# Altium integrated library Integrated_Library - 02.02.25 - 22.49.IntLib: 792 symbols (part 3 of 11) (continued)
## CMP-004-00015-2
designator D?, comment BAT54S-7-F
Surface Mount Schottky Barrier Diode, 30 V, 200 mA, -65 to 150 degC, 3-Pin SOT23, RoHS, Tape and Reel; Manufacturer: Diodes Inc; Max Surge Current: 600mA; Elements: 2; Forward Voltage: 800mV; Peak Reverse Current: 2uA; Recovery Time: 5ns; Forward Current: 200mA; Element Configuration: CommonCathode; Power: 200mW; Datasheet Version: Rev. 31-2, 10/2013; Package Quantity: 3000; RoHS Compliant: True; Packaging: TapeandReel; Datasheet URL: http://www.diodes.com/_files/datasheets/ds11005.pdf; Case/Package: TO-236-3; Max Operating Temperature: 125°C; Min Operating Temperature: -65°C; Manufacturer URL: http://www.diodes.com/; Package Reference: SOT23-3; Mounting Technology: SM; Pins: 3; Package Description: 3-Pin Small Outline Transistor, Body 2.9 x 1.3 mm, Pitch 0.96 mm
footprint DIOD-SOT23-3_V (SOT23, 3-Leads, Body 3x1.4mm, Pitch 0.95mm)
pins: 1 A, 2 K, 3 C

## CMP-004-00016-2
designator D?, comment SS12
Schottky Rectifier, 20 V, 1 A, -65 to 125 degC, 2-Pin DO-214AC, RoHS, Tape and Reel; Manufacturer: Fairchild; Forward Voltage: 500mV; Peak Reverse Current: 200uA; Max Surge Current: 40A; Min Operating Temperature: -65°C; Packaging: TapeandReel; Datasheet URL: https://www.fairchildsemi.com/datasheets/SS/SS12.pdf; Datasheet Version: Rev. 1.9, 01/2015; Package URL: https://www.fairchildsemi.com/package-drawings/DO/DO214AC.pdf; Package Description: 2-Pin Surface Mount Device, Body 4.375 x 2.725 mm; Manufacturer URL: https://www.fairchildsemi.com/; Mounting Technology: SM; Case/Package: SMA; RoHS Compliant: True; Package Quantity: 7500; Pins: 2; Max Operating Temperature: 125°C; Package Reference: DO-214AC-2
footprint FAIR-DO-214AC-2_V (DO-214, 2-Leads, Body 4.375x2.725mm)
pins: 1 A, 2 K

## CMP-004-00017-2
designator D?, comment SS12-E3/61T
Schottky Barrier Rectifier, 20 V, 1 A, -65 to 150 degC, 2-Pin DO-214AC (SMA), RoHS, Tape and Reel; Manufacturer: Vishay Semiconductor; Forward Voltage: 500mV; Peak Reverse Current: 6mA; Max Surge Current: 40A; Forward Current: 1A; Package Quantity: 1800; Datasheet URL: http://www.vishay.com/docs/88746/ss12.pdf; Manufacturer URL: http://www.vishay.com/; Package Reference: DO-214AC (SMA); Max Operating Temperature: 125°C; Mounting Technology: SM; Case/Package: SMA; Min Operating Temperature: -65°C; Package Description: 2-Pin Surface Mount Device, Body 4.245 x 2.665 mm; RoHS Compliant: True; Datasheet Version: Aug-15; Pins: 2; Packaging: TapeandReel
footprint VISH-DO-214AC_V (Molded Diode, 2-Leads, Body 4.5x2.79mm)
pins: 1 A, 2 K

## CMP-004-00018-2
designator D?, comment SS12-TP
Schottky Rectifier, 20 V, 1 A, -55 to 125 degC, 2-Pin DO-214AC, RoHS, Tape and Reel; Manufacturer: Micro Commercial Components; Forward Voltage: 450mV; Max Surge Current: 30A; Forward Current: 1A; Peak Reverse Current: 500uA; Package Quantity: 1; Packaging: CutTape; Datasheet Version: Rev. B, 11/2011; Manufacturer URL: http://www.mccsemi.com/; Max Operating Temperature: 125°C; Pins: 2; Min Operating Temperature: -55°C; Package Reference: DO-214AC-2; Case/Package: SMA; Package Description: 2-Pin Molded Diode, Body 4.315 x 2.705 mm; Mounting Technology: SM; Datasheet URL: http://www.mccsemi.com/up_pdf/SS12-SS110(HSMA).PDF; RoHS Compliant: True
footprint MCC-DO-214AC-2_V (Molded Diode, 2-Leads, Body 4.57x2.84mm)
pins: 1 A, 2 K

## CMP-004-00019-2
designator D?, comment CESD5V0AP
Uni-direction ESD Protection Diode, 5 V, 10 uA, 3-Pin SOT23, RoHS, Tape and Reel; Manufacturer: Jiangsu Changjiang Electronics Technology; Package Version: Rev. E, 09/2009; RoHS Compliant: Unknown; Mounting Technology: SM; Package Description: 3-Pin Small Outline Transistor, Body 2.9 x 1.3 mm, Pitch 0.95 mm; Datasheet URL: http://www.cj-elec.com/gallery/txUpfile/c44551eb678d297ed58d78171eee05d7.pdf; Case/Package: SOT23-3; Package URL: http://www.cj-elec.com/gallery/txUpfile/201412381536055.pdf; Package Reference: SOT23-3; Datasheet Version: Rev. C, 04/2014
footprint JSCJ-SOT23-3_V (SOT23, 3-Leads, Body 3x1.4mm, Pitch 0.95mm)
pins: 1 K, 2 K, 3 A

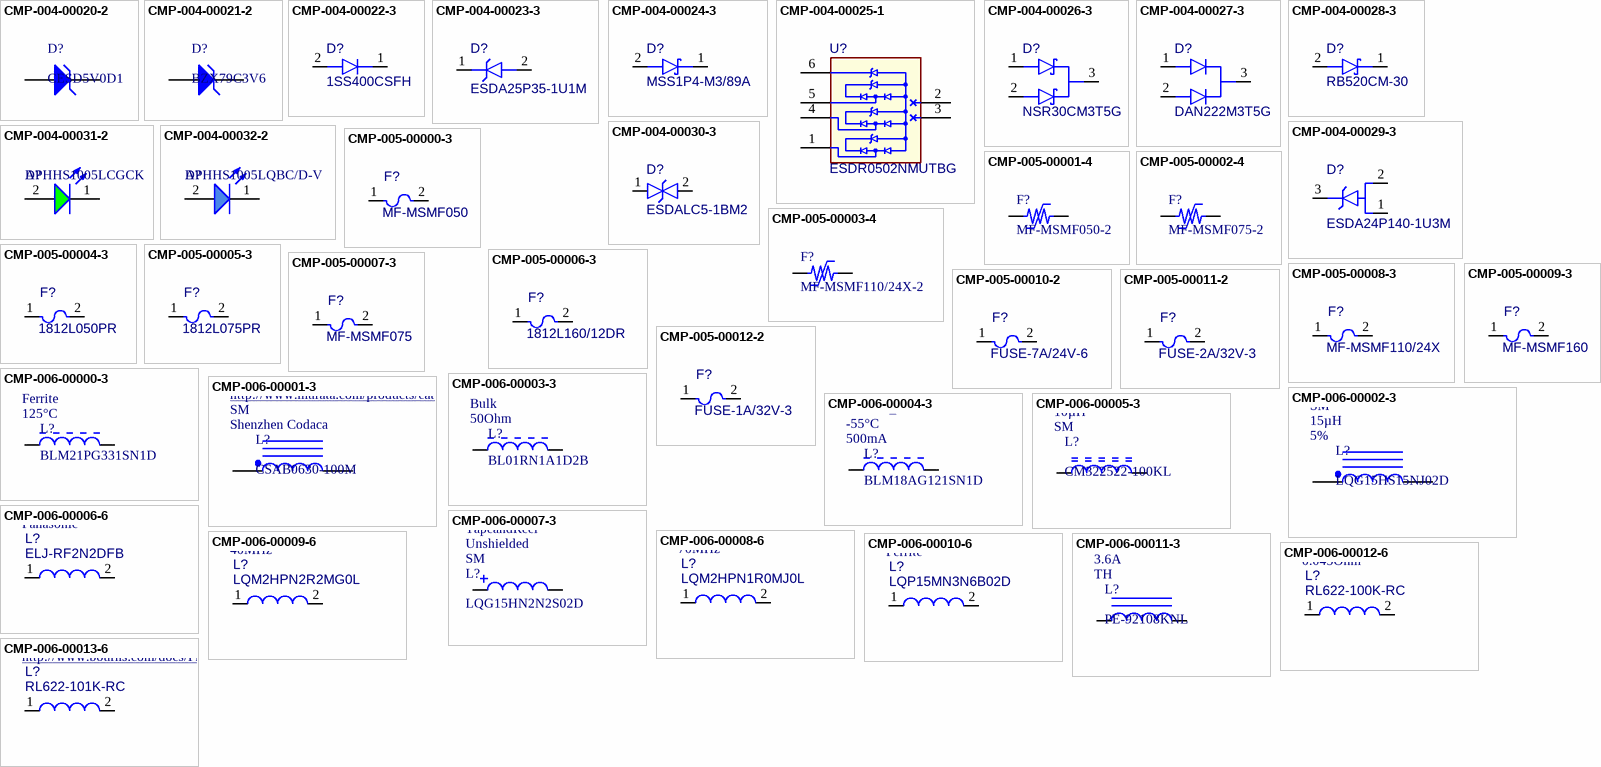
[diagram p7: symbols CMP-004-00020-2 to CMP-006-00013-6]

## CMP-004-00020-2
designator D?, comment CESD5V0D1
Uni-driection ESD Protection Diode, 5 V, 1 uA, 2-Pin SOD-123, RoHS, Tape and Reel; Manufacturer: Jiangsu Changjiang Electronics Technology; Datasheet URL: http://www.cj-elec.com/gallery/txUpfile/f05a5831e2d7f622a930855050fbe076.pdf; Datasheet Version: Rev. B, 04/2014; Package Description: 2-Pin Surface Mount Device, Body 2.7 x 1.6 mm; Package Reference: SOD-123-2; RoHS Compliant: Unknown; Package URL: http://www.cj-elec.com/txUpfile/201412112231195145.pdf; Case/Package: SOD-123-2; Mounting Technology: SM
footprint JSCJ-SOD-123-2_V (SOD, 2-Leads, Body 2.7x1.6mm)
pins: 1 A, 2 K

## CMP-004-00021-2
designator D?, comment BZX79C3V6
Zener Diode, 3.6 V, 5 mA, -65 to 200 degC, 2-Pin DO-35, RoHS, Bulk; Manufacturer: Fairchild Semiconductor; Tolerance: 6%; Power: 500mW; Forward Voltage: 1.5V; Impedance: 90Ohm; Package Quantity: 1000; Min Operating Temperature: -65°C; Datasheet Version: Rev. C1, 07/2007; Max Operating Temperature: 200°C; Mounting Technology: TH; Package Description: 2-Pin Through Hole Diode, Dia 1.72 mm, Body Length 3.805 mm; RoHS Compliant: True; Manufacturer URL: https://www.fairchildsemi.com/; Package Reference: DO-35-2; Case/Package: DO-35-2; Datasheet URL: https://www.fairchildsemi.com/datasheets/BZ/BZX79C3V6.pdf; Package URL: https://www.fairchildsemi.com/package-drawings/DO/DO35A.pdf; Pins: 2; Packaging: Bulk
footprint FAIR-DO-35-2 (TH, 2-Leads, Dia 1.91mm)
pins: 1 A, 2 K

## CMP-004-00022-3
designator D?, comment 1SS400CSFH
Switching Diode (High Speed Switching), 80 V, 100 mA, 2-Pin SOD-923, RoHS, Tape and Reel; Pins: 2; Mounting Technology: SMT
footprint ROHM-VMN2-2_V (VMN2, 2-Leads, Body 0.9x0.6mm, Pitch 0.95mm)
footprint ROHM-VMN2-2_V (VMN2, 2-Leads, Body 0.9x0.6mm, Pitch 0.95mm)
pins: 1 K, 2 A

## CMP-004-00023-3
designator D?, comment ESDA25P35-1U1M
TVS DIODE 22V 41V 1610; Peak Inverse Voltage: 23.3V; Max Surge Current: 35A; Mounting Technology: SMT; Case/Package: QFN1610 (0603); RoHS Compliant: Yes; Pins: 2
footprint STM-QFN1610 (SMD, 2-Leads, Body 1.6x1mm)
footprint STM-QFN1610 (SMD, 2-Leads, Body 1.6x1mm)
pins: 1 A, 2 A

## CMP-004-00024-3
designator D?, comment MSS1P4-M3/89A
Schottky Diodes & Rectifiers 1.0 Amp 40 Volt; Forward Voltage: 460mV; Max Surge Current: 25A; Max Operating Temperature: 150°C; Min Operating Temperature: -55°C; Pins: 2; Mounting Technology: SMT
footprint MicroSMP (DO-219AD) (SOD, 2-Leads, Body 2.3x1.4mm)
footprint MicroSMP (DO-219AD) (SOD, 2-Leads, Body 2.3x1.4mm)
pins: 1 K, 2 A

## CMP-004-00025-1
designator U?, comment ESDR0502NMUTBG
Ultra Low Capacitance ESD Protection Array for High Speed Data Line Protection, 6-Pin UDFN, Pb-Free, Tape and Reel; ComponentLink2Description: Datasheet; ComponentLink3URL: http://www.onsemi.com/pub_link/Collateral/517AA.PDF; Mounting Technology: SMT; ComponentLink1URL: http://www.onsemi.com/; Pins: 6; ComponentLink3Description: Package Specification; ComponentLink1Description: Manufacturer URL; ComponentLink2URL: http://www.onsemi.cn/pub_link/Collateral/ESDR0502N-D.PDF
footprint ONSC-UDFN-6-517AA-01_V (SON, 6-Leads, Body 1.2x1mm, Pitch 0.4mm)
footprint ONSC-UDFN-6-517AA-01_V (SON, 6-Leads, Body 1.2x1mm, Pitch 0.4mm)
pins: 1 GND (power), 2 NC, 3 NC, 4 D-, 5 D+, 6 VBUS (power)

## CMP-004-00026-3
designator D?, comment NSR30CM3T5G
Dual Common Cathode Schottky Barrier Diodes, 3-Pin SOT-723, Pb-Free, Tape and Reel; ComponentLink1Description: Manufacturer URL; ComponentLink1URL: http://www.onsemi.com/; Mounting Technology: SMT; ComponentLink3Description: Package Specification; ComponentLink2URL: http://www.onsemi.cn/pub_link/Collateral/NSR30CM3T5G-D.PDF; ComponentLink3URL: http://www.onsemi.cn/pub_link/Collateral/BAT54M3-D.PDF; Pins: 3; ComponentLink2Description: Datasheet
footprint ONSC-SOT-723-3-631AA-01_C_V (SOT23, 3-Leads, Body 1.25x0.85mm, Pitch 0.4mm)
footprint ONSC-SOT-723-3-631AA-01_C_V (SOT23, 3-Leads, Body 1.25x0.85mm, Pitch 0.4mm)
pins: 1 A1, 2 A2, 3 K

## CMP-004-00027-3
designator D?, comment DAN222M3T5G
Common Cathode Silicon Dual Switching Diodes, 3-Pin SOT-723, Pb-Free, Tape and Reel; Forward Current: 100mA; ComponentLink2URL: http://www.onsemi.cn/pub_link/Collateral/DAN222M3-D.PDF; ComponentLink3Description: Package Specification; Pins: 3; ComponentLink2Description: Datasheet; ComponentLink3URL: http://www.onsemi.com/pub_link/Collateral/631AA.PDF; ComponentLink1URL: http://www.onsemi.com/; Mounting Technology: SMT; ComponentLink1Description: Manufacturer URL
footprint ROHM-SOT723-3_V (SOT723, 3-Leads, Body 1.2x0.8mm, Pitch 0.8mm)
footprint ROHM-SOT723-3_V (SOT723, 3-Leads, Body 1.2x0.8mm, Pitch 0.8mm)
pins: 1 A1, 2 A2, 3 K

## CMP-004-00028-3
designator D?, comment RB520CM-30
DIODE SCHOTTKY 30V 100MA VMN2M; Case/Package: SMD/SMT; Pins: 2; Mounting Technology: SMT
footprint MicroSMP (DO-219AD) (SOD, 2-Leads, Body 2.3x1.4mm)
footprint ROHM-VMN2-2_V (VMN2, 2-Leads, Body 0.9x0.6mm, Pitch 0.95mm)
pins: 1 K, 2 A

## CMP-004-00029-3
designator D?, comment ESDA24P140-1U3M
TVS diode, 4500W, 22V standoff, 29.5V clamp; Peak Inverse Voltage: 22.7V; Max Surge Current: 140A; Forward Voltage: 700mV; Case/Package: 3-QFN; RoHS Compliant: Yes; Mounting Technology: SMT; Pins: 3
footprint STM-QFN3 (SMD, 3-Leads, Body 2x2mm)
footprint STM-QFN3 (SMD, 3-Leads, Body 2x2mm)
pins: 1 A, 2 A, 3 K

## CMP-004-00030-3
designator D?, comment ESDALC5-1BM2
Single Line Low Capacitance Transil™, 5 V, -55 to 150 degC, 2-Pin SOD-882, RoHS, Tape and Reel; Mounting Technology: SMT; Pins: 2
footprint STM-SOD-882_V (SOD-882, 2-Leads, Body 1x0.6mm)
footprint STM-SOD-882_V (SOD-882, 2-Leads, Body 1x0.6mm)
pins: 1 A, 2 A

## CMP-004-00031-2
designator D?, comment APHHS1005LCGCK
Green 570nm LED Indication - Discrete 1.9V 0402 (1005 Metric); MF: Kingbright; Design Item ID: APHHS1005LCGCK; Check_prices: https://www.snapeda.com/parts/APHHS1005LCGCK/Kingbright/view-part/?ref=eda; Component Type: Standard; MP: APHHS1005LCGCK; SnapEDA_Link: https://www.snapeda.com/parts/APHHS1005LCGCK/Kingbright/view-part/?ref=snap; Case/Package: 0402 Kingbright Corporation; Value: *; Pins: 2; Source: APHHS1005LCGCK.SchLib
footprint LED_APHHS1005LCGCK
pins: 1 K, 2 A

## CMP-004-00032-2
designator D?, comment APHHS1005LQBC/D-V
Blue 465nm LED Indication - Discrete 2.65V 0402 (1005 Metric); MF: Kingbright; Design Item ID: APHHS1005LQBC/D-V; Check_prices: https://www.snapeda.com/parts/APHHS1005LQBC/D-V/Kingbright/view-part/?ref=eda; Pins: 2; Source: APHHS1005LQBC_D-V.SchLib; SnapEDA_Link: https://www.snapeda.com/parts/APHHS1005LQBC/D-V/Kingbright/view-part/?ref=snap; MP: APHHS1005LQBC/D-V; Value: *; Component Type: Standard; Case/Package: 0402 Kingbright Corporation
footprint LED_APHHS1005LQBC%2FD-V
pins: 1 K, 2 A

## CMP-005-00000-3
designator F?, comment MF-MSMF050
PTC Resettable Fuse, 15 V, 500 mA, -40 to 85 degC, 2-Pin SMD, RoHS, Tape and Reel; Manufacturer: Bourns; Current Rating: 100A; Case/Package: MF-MSMF050-2; Package Reference: MF-MSMF050-2; Package Description: 2-Pin Surface Mount Device, Body 4.55 x 3.24 mm; Mounting Technology: SM; Datasheet Version: Rev. AG, 08/2016; Min Operating Temperature: -40°C; Max Operating Temperature: 85°C; RoHS Compliant: False; Packaging: TapeandReel; Datasheet URL: http://www.bourns.com/data/global/pdfs/mfmsmf.pdf
footprint LFUS-466_V (SMD, 2-Leads, Body 3.175x1.524mm)
footprint BOUR-MF-MSMF050-2_V (SMD, 2-Leads, Body 4.55x3.24mm)
pins: 1, 2

## CMP-005-00001-4
designator F?, comment MF-MSMF050-2
PTC Resettable Fuse, 15 V, 500 mA, -40 to 85 degC, 2-Pin SMD, RoHS, Tape and Reel; Manufacturer: Bourns; Nominal Supply Voltage: 15V; Current Rating: 100A; Resistance: 150mohm; Datasheet URL: http://www.bourns.com/docs/Product-Datasheets/mfmsmf.pdf; Packaging: TapeandReel; Package Description: 2-Pin Surface Mount Device, Body 4.55 x 3.24 mm; RoHS Compliant: True; Package Quantity: 2000; Lead Pitch: 4.73mm; Datasheet Version: Rev. AG, 08/2016; Max Operating Temperature: 85°C; Voltage Rating: 15V; Mounting Technology: SM; Case/Package: 1812; Min Operating Temperature: -40°C; Package Reference: MF-MSMF050-2
footprint BOUR-MF-MSMF050-2_V (SMD, 2-Leads, Body 4.55x3.24mm)
pins: 1, 2

## CMP-005-00002-4
designator F?, comment MF-MSMF075-2
PTC Resettable Fuse, 13.2 V, 750 mA, -40 to 85 degC, 2-Pin SMD, RoHS, Tape and Reel; Manufacturer: Bourns; Resistance: 450mohm; Current Rating: 100A; Voltage Rating: 13.2V; Package Reference: MF-MSMF050-2; Mounting Technology: SM; Max Operating Temperature: 85°C; Package Quantity: 2000; Min Operating Temperature: -40°C; Case/Package: 1812; Packaging: TapeandReel; Package Description: 2-Pin Surface Mount Device, Body 4.55 x 3.24 mm; Lead Pitch: 4.73mm; Nominal Supply Voltage: 13.2V; Datasheet Version: Rev. AG, 08/2016; Datasheet URL: http://www.bourns.com/docs/Product-Datasheets/mfmsmf.pdf; RoHS Compliant: True
footprint BOUR-MF-MSMF050-2_V (SMD, 2-Leads, Body 4.55x3.24mm)
pins: 1, 2

## CMP-005-00003-4
designator F?, comment MF-MSMF110/24X-2
PTC Resettable Fuse, 24 V, 1.1 A, -40 to 85 degC, 2-Pin SMD, RoHS, Tape and Reel; Manufacturer: Bourns; Resistance: 0.18Ohm; Current Rating: 20A; Nominal Supply Voltage: 24V; Max Operating Temperature: 85°C; Package Description: 2-Pin Surface Mount Device, Body 4.6 x 3.24 mm; Packaging: TapeandReel; Datasheet URL: http://www.bourns.com/docs/Product-Datasheets/mfmsmf.pdf; RoHS Compliant: True; Mounting Technology: SM; Case/Package: 1812; Package Reference: MF-MSMF110-24X-2; Datasheet Version: Rev. AG, 08/2016; Voltage Rating: 24V; Min Operating Temperature: -40°C
footprint BOUR-MF-MSMF110-24X-2_V (Chip Fuse, 2-Leads, Body 4.6x3.24mm)
pins: 1, 2

## CMP-005-00004-3
designator F?, comment 1812L050PR
POLY-FUSE(R) Resettable PTC, 15 V, 0.5 A, -40 to 85 degC, 2-Pin SMD, RoHS, Tape and Reel; Manufacturer: Littelfuse; Nominal Supply Voltage: 15V; Resistance: 1Ohm; Current Rating: 100A; Min Operating Temperature: -40°C; Package Description: 2-Pin Surface Mount Device, Body 4.55 x 3.24 mm; Package Quantity: 1; RoHS Compliant: True; Datasheet Version: Feb-16; Datasheet URL: http://www.littelfuse.com/~/media/electronics/datasheets/resettable_ptcs/littelfuse_ptc_1812l_datasheet.pdf.pdf; Case/Package: 1812; Packaging: TapeandReel; Voltage Rating: 15V; Max Operating Temperature: 85°C; Package Reference: 1812; Mounting Technology: SM
footprint LFUS-466_V (SMD, 2-Leads, Body 3.175x1.524mm)
footprint LFUS-1812L050_V (Chip Fuse, 2-Leads, Body 4.73x3.41mm)
pins: 1, 2

## CMP-005-00005-3
designator F?, comment 1812L075PR
POLY-FUSE(R) Resettable PTC, 13.2 V, 0.75 A, -40 to 85 degC, 2-Pin SMD, RoHS, Tape and Reel; Manufacturer: Littelfuse; Current Rating: 100A; Resistance: 450mohm; Nominal Supply Voltage: 13.2V; Mounting Technology: SM; Min Operating Temperature: -40°C; Package Quantity: 2000; Datasheet URL: http://www.littelfuse.com/~/media/electronics/datasheets/resettable_ptcs/littelfuse_ptc_1812l_datasheet.pdf.pdf; Package Description: 2-Pin Surface Mount Device, Body 4.55 x 3.24 mm; Datasheet Version: Feb-16; RoHS Compliant: True; Packaging: TapeandReel; Package Reference: 1812; Case/Package: 1812; Max Operating Temperature: 85°C
footprint LFUS-466_V (SMD, 2-Leads, Body 3.175x1.524mm)
footprint LFUS-1812L075_V (Chip Fuse, 2-Leads, Body 4.73x3.41mm)
pins: 1, 2

## CMP-005-00006-3
designator F?, comment 1812L160/12DR
POLY-FUSE(R) Resettable PTC, 12 V, 1.6 A, -40 to 85 degC, 2-Pin SMD, RoHS, Tape and Reel; Manufacturer: Littelfuse; Resistance: 100mohm; Current Rating: 100A; Nominal Supply Voltage: 12V; Max Operating Temperature: 85°C; Case/Package: 1812; Package Quantity: 1500; Datasheet URL: http://www.littelfuse.com/~/media/electronics/datasheets/resettable_ptcs/littelfuse_ptc_1812l_datasheet.pdf.pdf; Package Description: 2-Pin Surface Mount Device, Body 4.55 x 3.24 mm; Package Reference: 1812; Packaging: TapeandReel; Datasheet Version: Feb-16; Min Operating Temperature: -40°C; Mounting Technology: SM; RoHS Compliant: True
footprint LFUS-466_V (SMD, 2-Leads, Body 3.175x1.524mm)
footprint LFUS-1812L16012_V (Chip Fuse, 2-Leads, Body 4.73x3.41mm)
pins: 1, 2

## CMP-005-00007-3
designator F?, comment MF-MSMF075
PTC Resettable Fuse, 13.2 V, 100 A, -40 to 85 degC, 2-Pin SMD, RoHS, Tape and Reel; Manufacturer: Bourns; Current Rating: 100A; Package Reference: MF-MSMF075; Mounting Technology: SM; Datasheet URL: http://www.bourns.com/docs/Product-Datasheets/mfmsmf.pdf; Datasheet Version: Rev. AG, 08/2016; RoHS Compliant: False; Package Description: 2-Pin Surface Mount Device, Body 4.55 x 3.24 mm; Case/Package: MF-MSMF075
footprint LFUS-466_V (SMD, 2-Leads, Body 3.175x1.524mm)
footprint BOUR-MF-MSMF075_V (SMD, 2-Leads, Body 4.55x3.24mm)
pins: 1, 2

## CMP-005-00008-3
designator F?, comment MF-MSMF110/24X
PTC Resettable Fuse, 24 V, 20 A, -40 to 85 degC, 2-Pin SMD, RoHS, Tape and Reel; Manufacturer: Bourns; Current Rating: 20A; Package Description: 2-Pin Surface Mount Device, Body 4.6 x 3.24 mm; Mounting Technology: SM; Datasheet Version: Rev. AG, 08/2016; Package Reference: MF-MSMF110-24X-2; Datasheet URL: http://www.bourns.com/docs/Product-Datasheets/mfmsmf.pdf; Case/Package: MF-MSMF110-24X-2; RoHS Compliant: False
footprint LFUS-466_V (SMD, 2-Leads, Body 3.175x1.524mm)
footprint BOUR-MF-MSMF110-24X-2_V (Chip Fuse, 2-Leads, Body 4.6x3.24mm)
pins: 1, 2

## CMP-005-00009-3
designator F?, comment MF-MSMF160
PTC Resettable Fuse, 8 V, 100 A, -40 to 85 degC, 2-Pin SMD, RoHS, Tape and Reel; Manufacturer: Bourns; Current Rating: 100A; Datasheet URL: http://www.bourns.com/docs/Product-Datasheets/mfmsmf.pdf; Mounting Technology: SM; Package Reference: MF-MSMF160; Case/Package: MF-MSMF160; Datasheet Version: Rev. AG, 08/2016; RoHS Compliant: False; Package Description: 2-Pin Surface Mount Device, Body 4.55 x 3.24 mm
footprint LFUS-466_V (SMD, 2-Leads, Body 3.175x1.524mm)
footprint BOUR-MF-MSMF160_V (SMD, 2-Leads, Body 4.55x3.24mm)
pins: 1, 2

## CMP-005-00010-2
designator F?, comment FUSE-7A/24V-6
Surface Mount Fuses 7A 24V VFA SLIMLINE; Current Rating: 7A; Pins: 2
footprint LFUS-466_V (SMD, 2-Leads, Body 3.175x1.524mm)
footprint LFUS-466_V (SMD, 2-Leads, Body 3.175x1.524mm)
pins: 1, 2

## CMP-005-00011-2
designator F?, comment FUSE-2A/32V-3
Fast Acting Fuse, 2 A, 32 V, -55 to 90 degC, 2-Pin SMD, RoHS, Tape and Reel; Current Rating: 2A; Case/Package: LFUS-467; Mounting Technology: SurfaceMount; Pins: 2
footprint LFUS-466_V (SMD, 2-Leads, Body 3.175x1.524mm)
footprint LFUS-467_V (SMD, 2-Leads, Body 1.6x0.813mm)
pins: 1, 2

## CMP-005-00012-2
designator F?, comment FUSE-1A/32V-3
Fast Acting Fuse, 1 A, 32 V, -55 to 90 degC, 2-Pin SMD, RoHS, Tape and Reel; Current Rating: 1A; Case/Package: LFUS-467; Pins: 2
footprint LFUS-466_V (SMD, 2-Leads, Body 3.175x1.524mm)
footprint LFUS-467_V (SMD, 2-Leads, Body 1.6x0.813mm)
pins: 1, 2

## CMP-006-00000-3
designator L?, comment BLM21PG331SN1D  Max Operating Temperature: 125°C  Core Material: Ferrite  Case/Package: 0805  Mounting Technology: SM  Packaging: TapeandReel  Current Rating: 1.5A  Impedance: 330Ohm  Min Operating Temperature: -55°C  RoHS Compliant: True  Datasheet Version: Nov-11  Package Quantity: 4000  Package Description: 2-Pin Surface Mount Device, Body 2 x1.25 mm  Resistance: 90mohm  Tolerance: 25%  Manufacturer: Murata
IND, Chip Ferrite Bead, 330 Ohm, +/- 25%, 1.5 A, -55 to 125 degC, 0805 (2012 Metric), Tape and Reel; Datasheet URL: http://psearch.en.murata.com/inductor/product/LQG15HS15NJ02_.pdf; Max Current Rating: 1.5A; Package Reference: 0805
footprint INDC2013X105X50LL20T20 (Chip Inductor, 2-Leads, Body 2.2x1.45mm, IPC High Density)
footprint INDC2013X105X50NL20T20 (Chip Inductor, 2-Leads, Body 2.2x1.45mm, IPC Medium Density)
footprint INDC2013X105X50ML20T20 (Chip Inductor, 2-Leads, Body 2.2x1.45mm, IPC Low Density)
pins: 1, 2

## CMP-006-00001-3
designator L?, comment CSAB0630-100M  Manufacturer: Shenzhen Codaca  Mounting Technology: SM  Tolerance: 20%  RoHS Compliant: Unknown  Datasheet Version: Mar-14  Package Description: 2-Pin Surface Mount Device, Body 6 x 6 mm  Inductance: 10µH
Molded Inductor, 10 uH, +/- 20%, 77.2 mOhm, -55 to 125 degC, 2-Pin SMD, RoHS, Tape and Reel; Datasheet URL: http://www.murata.com/products/catalog/pdf/c31e.pdf; Manufacturer URL: www.codaca.com.cn; Case/Package: CSAB0630-100M; Package Reference: CSAB0630-100M
footprint CODA-CSAB0630-100M_V (Molded Inductor, 2-Leads, Body 6.2x6.2mm)
pins: 1, 2

## CMP-006-00002-3
designator L?, comment LQG15HS15NJ02D  Tolerance: 5%  Inductance: 15µH  Mounting Technology: SM  Current Rating: 300mA  RoHS Compliant: True  Max Operating Temperature: 125°C  Package Description: 2-Pin Surface Mount Device, Body 1 x 0.5 mm  Self Resonant Frequency: 2.5GHz  Package Reference: 0402  Shielding: Unshielded  Q Factor: 8  Min Operating Temperature: -55°C  Datasheet Version: Nov-16  Manufacturer: Murata  Packaging: TapeandReel  Core Material: Air  Package Quantity: 10000
Chip Inductor, 15 nH, +/- 5%, 100 MHz, -55 to 125 degC, 0402 (1005 Metric), RoHS, Paper Tape; Datasheet URL: http://psearch.en.murata.com/inductor/product/LQG15HN2N2S02_.pdf; Case/Package: 0402; Inductance Tolerance: 5%
footprint INDC1005X55X25LL05T10_A (Chip Inductor, 2-Leads, Body 1.05x0.55mm, IPC High Density)
footprint INDC1005X55X25NL05T10_A (Chip Inductor, 2-Leads, Body 1.05x0.55mm, IPC Medium Density)
footprint INDC1005X55X25ML05T10_A (Chip Inductor, 2-Leads, Body 1.05x0.55mm, IPC Low Density)
pins: 1, 2

## CMP-006-00003-3
designator L?, comment BL01RN1A1D2B  Impedance: 50Ohm  Packaging: Bulk  Package Reference: INDA65-500X360  Case/Package: Axial  Package Quantity: 500  Diameter: 3.6mm  Datasheet Version: May-16  Min Operating Temperature: -40°C  Current Rating: 7A  Mounting Technology: TH  Manufacturer: Murata  Core Material: Ferrite  RoHS Compliant: True  Package Description: 2-Pin Axial Lead, Dia 3.6 mm, Body Length 5 mm  Max Operating Temperature: 85°C  Pins: 2
EMI Suppression Filter (Lead Type EMIFIL(R)), 7 A, -40 to 85 degC, 2-Pin THD, RoHS, Bulk; Datasheet URL: http://www.murata.com/en-us/products/productdata/8796738977822/ENFA0005.pdf; Max Current Rating: 7A
footprint INDA65-500X360 (Axial Lead, 2-Leads, Dia 3.6mm, Body Length 5mm, Pin Spacing 7.9mm)
pins: 1, 2

## CMP-006-00004-3
designator L?, comment BLM18AG121SN1D  Max Current Rating: 500mA  Min Operating Temperature: -55°C  Package Reference: BLM18_H950-2  Max Operating Temperature: 125°C  Tolerance: 25%  Impedance: 120Ohm  Core Material: Ferrite  Datasheet Version: Jun-12  Manufacturer: Murata  Packaging: TapeandReel  Resistance: 200mohm  Package Quantity: 4000  Case/Package: 0603  RoHS Compliant: True
Chip Ferrite Bead for General Use, 120 Ohm, 500 mA, -55 to 125 degC, 0603 (1608 Metric), RoHS, Tape and Reel; Current Rating: 500mA; Datasheet URL: https://statics3.seeedstudio.com/images/opl/datasheet/303010016.pdf
footprint MURA-BLM18-F-H1-CHIP-2_V (Chip Ferrite Bead, 2-Leads, Body 1.6x0.8mm, Height 0.95mm, Flow)
pins: 1, 2

## CMP-006-00005-3
designator L?, comment CM322522-100KL  Mounting Technology: SM  Inductance: 10µH  Current Rating: 140mA  Q Factor: 30  Min Operating Temperature: -20°C  Self Resonant Frequency: 30MHz  Case/Package: 1210  Pins: 2  Package Description: 2-Pin Surface Mount Device, Body 3.2 x 2.5 mm  Manufacturer: Bourns  RoHS Compliant: True  Core Material: Ferrite  Shielding: Unshielded  Max Operating Temperature: 100°C  Inductance Tolerance: 10%  Resistance: 2.1Ohm  Packaging: TapeandReel  Package Quantity: 1  Datasheet Version: Aug-14
Chip Inductor, 10 uH, +/- 10%, -40 to 125 degC, 1210 (3225 Metric), RoHS, Tape and Reel; Datasheet URL: http://www.murata.com/~/media/webrenewal/support/library/catalog/products/emc/emifil/c30e.ashx?la=en-gb; Package Reference: 1210; Tolerance: 10%
footprint BOUR-CM322522_V (Inductor, 2-Leads, Body 3.2x2.5mm, Pitch 3.05mm)
pins: 1, 2

## CMP-006-00006-6
designator L?, comment ELJ-RF2N2DFB  value 2.2µH  Manufacturer: Panasonic  Case/Package: 0402  Shielding: Unshielded  RoHS Compliant: True  Package Description: 2-Pin Surface Mount Device, Body 1 x 0.5 mm  Packaging: TapeandReel  Datasheet Version: Sep-12  Package Quantity: 10000  Current Rating: 400mA  Tolerance: 5%  Min Operating Temperature: -20°C  Core Material: Ceramic  Mounting Technology: SM  Q Factor: 8  Max Operating Temperature: 85°C
Chip Inductor, 2.2 nH, +/- 0.3 nH, 400 mA, -40 to 85 degC, 0402 (1005 Metric), RoHS, Tape and Reel; Datasheet URL: http://www.bourns.com/docs/Product-Datasheets/cm322522.pdf; Package Reference: 0402
footprint SUSUMU-PCMB063T_V (SMD, 2-Leads, Body 7.8x6.7mm)
footprint IND1005X55X20VL5T10 (Chip Inductor, 2-Leads, Body 1.05x0.55mm)
pins: 1, 2

## CMP-006-00007-3
designator L?, comment LQG15HN2N2S02D  Mounting Technology: SM  Shielding: Unshielded  Packaging: TapeandReel  Package Description: 2-Pin Surface Mount Device, Body 1 x 0.5 mm  Inductance: 2.2µH  Q Factor: 8  Pins: 2  Manufacturer: Murata  Self Resonant Frequency: 6GHz  Max Operating Temperature: 125°C  Case/Package: 0402  Resistance: 0.15Ohm  Current Rating: 300mA  Min Operating Temperature: -55°C  Tolerance: 5%  Core Material: Air  RoHS Compliant: True  Package Quantity: 10000  Datasheet Version: Sep-10
Chip Inductor, 2.2 nH, +/- 0.3 nH, 300 mA, -55 to 125 degC, 0402 (1005 Metric), RoHS, Tape and Reel; Datasheet URL: http://industrial.panasonic.com/cdbs/www-data/pdf/AGA0000/AGA0000C49.pdf; Package Reference: 0402
footprint INDC1005X55X25ML5T10 (Chip Inductor, 2-Leads, Body 1.05x0.55mm, IPC Low Density)
footprint INDC1005X55X25LL5T10 (Chip Inductor, 2-Leads, Body 1.05x0.55mm, IPC High Density)
footprint INDC1005X55X25NL5T10 (Chip Inductor, 2-Leads, Body 1.05x0.55mm, IPC Medium Density)
pins: 1, 2

## CMP-006-00008-6
designator L?, comment LQM2HPN1R0MJ0L  value 1µH  Self Resonant Frequency: 70MHz  Current Rating: 1.5A  Shielding: Shielded  Datasheet Version: Aug-16  RoHS Compliant: True  Case/Package: 1008  Package Description: 2-Pin Surface Mount Device, Body 2.5 x 2 mm  Package Quantity: 3000  Core Material: Ferrite  Tolerance: 20%  Min Operating Temperature: -40°C  Packaging: TapeandReel  Mounting Technology: SM  Max Operating Temperature: 85°C  Resistance: 0.09Ohm  Manufacturer: Murata
Chip Inductor, 1 uH, +/- 20%, 1 MHz, -55 to 125 degC, 1008 (2520 Metric), RoHS, Tape and Reel; Datasheet URL: http://psearch.en.murata.com/inductor/product/LQM2HPN1R0MJ0%23.pdf; Package Reference: 1008
footprint SUSUMU-PCMB063T_V (SMD, 2-Leads, Body 7.8x6.7mm)
footprint INDC2520X120X60LL20T20 (Chip Inductor, 2-Leads, Body 2.70x2.20mm, IPC High Density)
footprint INDC2520X120X60ML20T20 (Chip Inductor, 2-Leads, Body 2.70x2.20mm, IPC Low Density)
footprint INDC2520X120X60NL20T20 (Chip Inductor, 2-Leads, Body 2.70x2.20mm, IPC Medium Density)
pins: 1, 2

## CMP-006-00009-6
designator L?, comment LQM2HPN2R2MG0L  value 2.2µH  Self Resonant Frequency: 40MHz  Current Rating: 1.3A  Package Description: 2-Pin Surface Mounted Device, Body 2.5 x 2 mm  Tolerance: 20%  Max Operating Temperature: 125°C  Mounting Technology: SM  Package Reference: 1008  Core Material: Ferrite  RoHS Compliant: True  Package Quantity: 3000  Manufacturer: Murata  Shielding: Shielded  Packaging: TapeandReel  Min Operating Temperature: -55°C  Datasheet Version: Aug-16
Chip Inductor, 2.2 uH, +/- 20%, -55 to 125 degC, 1008 (2520 Metric), RoHS, Tape and Reel; Case/Package: 1008; Datasheet URL: http://psearch.en.murata.com/inductor/product/LQM2HPN2R2MG0%23.pdf
footprint SUSUMU-PCMB063T_V (SMD, 2-Leads, Body 7.8x6.7mm)
footprint INDC2520X100X60NL20T20 (Chip Inductor, 2-Leads, Body 2.7x2.2mm, IPC Medium Density)
footprint INDC2520X100X60ML20T20 (Chip Inductor, 2-Leads, Body 2.7x2.2mm, IPC Low Density)
footprint INDC2520X100X60LL20T20 (Chip Inductor, 2-Leads, Body 2.7x2.2mm, IPC High Density)
pins: 1, 2

## CMP-006-00010-6
designator L?, comment LQP15MN3N6B02D  value 3.6nH  Core Material: Ferrite  Self Resonant Frequency: 6GHz  Current Rating: 170mA  Datasheet Version: Apr-16  Case/Package: 0402  Mounting Technology: SM  Shielding: Unshielded  Min Operating Temperature: -40°C  RoHS Compliant: True  Package Description: 2-Pin Surface Mount Device, Body 1 x 0.5 mm  Max Operating Temperature: 85°C  Q Factor: 13  Package Quantity: 10000  Packaging: TapeandReel  Manufacturer: Murata
Inductor, 500 MHz, 170 mA, 0.5 Ohm, -40 to 85 degC, 01005 (0402 Metric), RoHS, Tape and Reel; Datasheet URL: http://download.siliconexpert.com/pdfs/2016/4/21/8/25/31/646/mrt_/manual/797549851250188lqp15mn3n6b0223.pdf; Package Reference: 0402
footprint SUSUMU-PCMB063T_V (SMD, 2-Leads, Body 7.8x6.7mm)
footprint MURA-LQP15MN3N6B02D-2_L (Chip Inductor, 2-Leads, Body 1.10x0.60mm, IPC High Density)
footprint MURA-LQP15MN3N6B02D-2_N (Chip Inductor, 2-Leads, Body 1.10x0.60mm, IPC Medium Density)
footprint MURA-LQP15MN3N6B02D-2_M (Chip Inductor, 2-Leads, Body 1.10x0.60mm, IPC Low Density)
pins: 1, 2

## CMP-006-00011-3
designator L?, comment PE-92108KNL  Mounting Technology: TH  Current Rating: 3.6A  Lead Pitch: 11.44mm  Min Operating Temperature: -40°C  RoHS Compliant: True  Inductance: 67µH  Package Quantity: 55  Manufacturer: Pulse Electronics  Packaging: Tray  Datasheet Version: Feb-15  Max Operating Temperature: 130°C  Package Description: 2-Pin Through Hole Device, Body 24.14 x 15.5 mm  Tolerance: 20%  Shielding: Unshielded  Case/Package: Radial  Resistance: 0.045Ohm  Package Reference: PE-92108KNL-KM4-2
THT Power Inductor, 67 uH, 0.045 Ohm, -40 to 130 degC, 2-Pin THD (KM4), RoHS, Tray; Inductance Tolerance: 20%; Datasheet URL: http://productfinder.pulseeng.com/products/datasheets/P635.pdf
footprint PULS-PE-92108KNL-KM4-2 (THD, 2-Leads, Body 24.64x15.5mm)
pins: 1, 2

## CMP-006-00012-6
designator L?, comment RL622-100K-RC  value 10µH  Resistance: 0.045Ohm  Lead Pitch: 5mm  Min Operating Temperature: -55°C  Datasheet Version: Aug-10  Package Reference: INDR62-500-1100X850X1100  Package Description: 2-Pin Radial Lead, Dia 8.5 mm, Pitch 5 mm  Package Quantity: 100  Core Material: Ferrite  Current Rating: 3A  Packaging: Bulk  Mounting Technology: TH  Case/Package: Radial  Pins: 2  Inductance Tolerance: 10%  Diameter: 8.5mm  Shielding: Unshielded  Max Operating Temperature: 105°C  RoHS Compliant: True  Manufacturer: Bourns  Self Resonant Frequency: 14MHz  Q Factor: 50
Radial Inductor, 10 uH, +/- 10%, 3 A, -55 to 105 degC, 2-Pin THD, RoHS, Bulk; Datasheet URL: http://www.bourns.com/docs/Product-Datasheets/rl622_series.pdf; Tolerance: 10%
footprint SUSUMU-PCMB063T_V (SMD, 2-Leads, Body 7.8x6.7mm)
footprint INDR62-500-1100X850X1100 (THD, 2-Leads, Dia 8.5mm, Pitch 5mm)
pins: 1, 2

## CMP-006-00013-6
designator L?, comment RL622-101K-RC  value 100µH  Pins: 2  Inductance Tolerance: 10%  Packaging: Bulk  Q Factor: 20  Shielding: Unshielded  Manufacturer: Bourns  Diameter: 8.5mm  Core Material: Ferrite  RoHS Compliant: True  Max Operating Temperature: 105°C  Self Resonant Frequency: 3.7MHz  Package Quantity: 100  Resistance: 0.28Ohm  Package Reference: INDR62-500-1100X850X1100  Mounting Technology: TH  Current Rating: 910mA  Lead Pitch: 5mm  Datasheet Version: Aug-10  Min Operating Temperature: -55°C  Package Description: 2-Pin Radial Lead, Dia 8.5 mm, Pitch 5 mm  Case/Package: Radial
Radial Inductor, 100 uH, +/- 10%, 0.91 A, -55 to 105 degC, 2-Pin THD, RoHS, Bulk; Datasheet URL: http://www.bourns.com/docs/Product-Datasheets/rl622_series.pdf; Tolerance: 10%
footprint SUSUMU-PCMB063T_V (SMD, 2-Leads, Body 7.8x6.7mm)
footprint INDR62-500-1100X850X1100 (THD, 2-Leads, Dia 8.5mm, Pitch 5mm)
pins: 1, 2

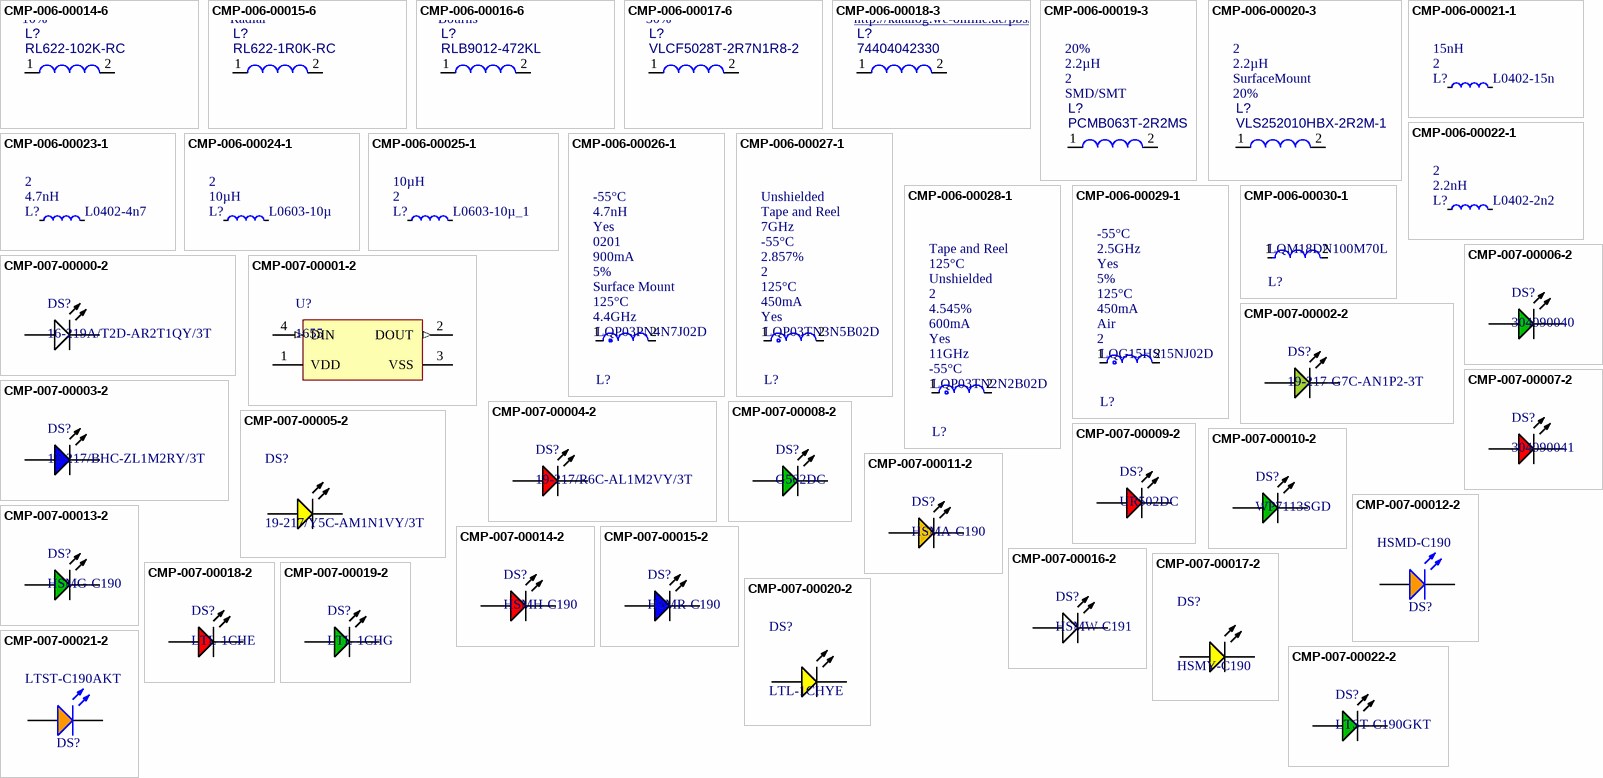
[diagram p8: symbols CMP-006-00014-6 to CMP-007-00022-2]

## CMP-006-00014-6
designator L?, comment RL622-102K-RC  value 1mH  Tolerance: 10%  Shielding: Unshielded  Package Reference: INDR62-500-1100X850X1100  Mounting Technology: TH  Lead Pitch: 5mm  Self Resonant Frequency: 1.3MHz  Packaging: Bulk  Package Description: 2-Pin Radial Lead, Dia 8.5 mm, Pitch 5 mm  Max Operating Temperature: 105°C  Package Quantity: 100  Core Material: Ferrite  Q Factor: 50  Manufacturer: Bourns  Current Rating: 290mA  Resistance: 2.9Ohm  Datasheet Version: Aug-10  Pins: 2  Case/Package: Radial  Diameter: 8.5mm  Min Operating Temperature: -55°C  RoHS Compliant: True
Radial Inductor, 1 mH, +/- 10%, 290 mA, -55 to 105 degC, 2-Pin THD, RoHS, Bulk; Datasheet URL: https://www.bourns.com/pdfs/rl622_series.pdf; Inductance Tolerance: 10%
footprint SUSUMU-PCMB063T_V (SMD, 2-Leads, Body 7.8x6.7mm)
footprint INDR62-500-1100X850X1100 (THD, 2-Leads, Dia 8.5mm, Pitch 5mm)
pins: 1, 2

## CMP-006-00015-6
designator L?, comment RL622-1R0K-RC  value 1µH  Case/Package: Radial  Self Resonant Frequency: 150MHz  Max Operating Temperature: 105°C  Lead Pitch: 5mm  Manufacturer: Bourns  Tolerance: 10%  Current Rating: 10A  Core Material: Ferrite  Datasheet Version: Aug-10  Mounting Technology: TH  Packaging: Bulk  Package Description: 2-Pin Radial Lead, Dia 8.5 mm, Pitch 5 mm  Min Operating Temperature: -55°C  RoHS Compliant: True  Package Reference: INDR62-500-1100X850X1100  Shielding: Unshielded  Diameter: 8.5mm  Package Quantity: 100  Resistance: 0.013Ohm
Radial Inductor, 1 uH, +/- 10%, 10 A, -55 to 105 degC, 2-Pin THD, RoHS, Bulk; Datasheet URL: http://www.bourns.com/docs/Product-Datasheets/rl622_series.pdf; Inductance Tolerance: 10%
footprint SUSUMU-PCMB063T_V (SMD, 2-Leads, Body 7.8x6.7mm)
footprint INDR62-500-1100X850X1100 (THD, 2-Leads, Dia 8.5mm, Pitch 5mm)
pins: 1, 2

## CMP-006-00016-6
designator L?, comment RLB9012-472KL  value 4.7µH  Manufacturer: Bourns  Lead Pitch: 5mm  Core Material: Ferrite  Datasheet Version: Mar-15  Package Reference: INDR70-500-1220X900X1220  Package Description: 2-Pin Through Hole Device, Dia 9 mm, Height 12.2 mm  Min Operating Temperature: -55°C  Shielding: Unshielded  Mounting Technology: TH  Current Rating: 240mA  Tolerance: 10%  Pins: 2  Q Factor: 15  RoHS Compliant: True  Packaging: Bulk  Package Quantity: 200  Self Resonant Frequency: 500kHz  Max Operating Temperature: 125°C  Case/Package: Radial  Inductance Tolerance: 5%
Radial Inductor, 4.7 mH, +/- 10%, 0.24 A, -55 to 125 degC, 2-Pin THD, RoHS, Bulk; Datasheet URL: http://www.bourns.com/docs/Product-Datasheets/rlb9012.pdf
footprint SUSUMU-PCMB063T_V (SMD, 2-Leads, Body 7.8x6.7mm)
footprint INDR70-500-1220X900X1220 (THD, 2-Leads, Dia 9mm)
pins: 1, 2

## CMP-006-00017-6
designator L?, comment VLCF5028T-2R7N1R8-2  value 2.7µH  Tolerance: 30%  Package Quantity: 500  Manufacturer: TDK  Datasheet Version: Apr-16  Resistance: 0.033Ohm  Max Operating Temperature: 105°C  RoHS Compliant: True  Shielding: Shielded  Min Operating Temperature: -40°C  Packaging: TapeandReel  Core Material: Ferrite  Current Rating: 1.82A  Package Description: 2-Pin Surface Mount Device, Body 5.2 x 5.3 mm  Mounting Technology: SM  Package Reference: VLCF5028-2  Case/Package: 5028
Inductor for Power Circuits, 2.7 uH, +/- 30%,100 KHz, 1.82 A, -40 to 105 degC, 2-Pin SMD, RoHS, Reel; Datasheet URL: https://product.tdk.com/info/en/catalog/datasheets/inductor_commercial_power_vlcf5028-2_en.pdf; Saturation Current: 1.82A; Inductance Tolerance: 30%
footprint SUSUMU-PCMB063T_V (SMD, 2-Leads, Body 7.8x6.7mm)
footprint TDK-VLCF5028-2_V (SMD, 2-Leads, Body 5.2x5.3mm)
pins: 1, 2

## CMP-006-00018-3
designator L?, comment 74404042330  value 33µH  ComponentLink2Description: Datasheet  Pins: 2  ComponentLink1Description: Manufacturer URL  Tolerance: 20%
WE-LQS SMD Power Inductor, L=33 µH; ComponentLink2URL: http://katalog.we-online.de/pbs/datasheet/74404042330.pdf; ComponentLink1URL: http://www.we-online.com
footprint SUSUMU-PCMB063T_V (SMD, 2-Leads, Body 7.8x6.7mm)
footprint WE-LQS 4018 (SMD Power Inductor, 2-Leads, Body 4.0x4.0mm)
pins: 1, 2

## CMP-006-00019-3
designator L?, comment PCMB063T-2R2MS  value 2.2µH  Case/Package: SMD/SMT  Pins: 2  Tolerance: 20%
Shielded Wirewound Inductor, 2.2 uH, +/- 20%, -20 to 120 degC, 2-Pin SMD, RoHS, Tape and Reel
footprint SUSUMU-PCMB063T_V (SMD, 2-Leads, Body 7.8x6.7mm)
footprint SUSUMU-PCMB063T_V (SMD, 2-Leads, Body 7.8x6.7mm)
pins: 1, 2

## CMP-006-00020-3
designator L?, comment VLS252010HBX-2R2M-1  value 2.2µH  Tolerance: 20%  Mounting Technology: SurfaceMount  Pins: 2
Inductor for Power Circuit, 2.2 uH, +/- 20%, -40 to 105 degC, 2-Pin SMD, RoHS, Tape and Reel
footprint SUSUMU-PCMB063T_V (SMD, 2-Leads, Body 7.8x6.7mm)
footprint TDK-VLS252010_V (SMD, 2-Leads, Body 2.5x2mm)
pins: 1, 2

## CMP-006-00021-1
designator L?, comment L0402-15n  value 15nH  Pins: 2
High frequency chip inductor ±10%; Part Number: L0402-15n; Pad Count: 2; Design Item ID: L0402-15n; LatestRevisionDate: 2012-09-19; Published: 2010-07-12; Source: nrf52840_qiaa.SCHLIB; Footprint Doc: 0402; Component Type: Standard
footprint INDC1608X06L
footprint INDC1005X04L
pins: 1, 2

## CMP-006-00022-1
designator L?, comment L0402-2n2  value 2.2nH  Pins: 2
High frequency chip inductor ±5%; Published: 2009-05-08; Component Type: Standard; Pad Count: 2; Source: nrf52840_qiaa.SCHLIB; Part Number: L0402-2n2; Design Item ID: L0402-2n2; Footprint Doc: 0402; LatestRevisionDate: 2012-09-19
footprint INDC1608X06L
footprint INDC1005X04L
pins: 1, 2

## CMP-006-00023-1
designator L?, comment L0402-4n7  value 4.7nH  Pins: 2
High frequency chip inductor ±5%; Component Type: Standard; Footprint Doc: 0402; Source: nrf52840_qiaa.SCHLIB; Pad Count: 2; LatestRevisionDate: 2012-09-19; Published: 2009-05-08; Part Number: L0402-4n7; Design Item ID: L0402-4n7
footprint INDC1608X06L
footprint INDC1005X04L
pins: 1, 2

## CMP-006-00024-1
designator L?, comment L0603-10µ  value 10µH  Pins: 2
Chip inductor, IDC,min = 50 mA, ±20%; Component Type: Standard; LatestRevisionDate: 2012-09-19; Published: 2010-02-24; Design Item ID: L0603-10µ; Source: nrf52840_qiaa.SCHLIB; Footprint Doc: 0603; Part Number: L0603-10µ; Pad Count: 2
footprint INDC1608X06L
footprint INDC1608X06L (Chip Inductor, 2-Leads, Body 1.6x0.8mm, IPC High Density)
pins: 1, 2

## CMP-006-00025-1
designator L?, comment L0603-10µ_1  value 10µH  Pins: 2
Chip inductor, IDC,min = 80 mA, ±20%; Pad Count: 2; Footprint Doc: 0603; LatestRevisionDate: 2012-09-19; Design Item ID: L0603-10µ_1; Part Number: L0603-10µ; Published: 2010-02-24; Source: nrf52840_qiaa.SCHLIB; Component Type: Standard
footprint INDC1608X06L
footprint INDC1608X06L (Chip Inductor, 2-Leads, Body 1.6x0.8mm, IPC High Density)
pins: 1, 2

## CMP-006-00026-1
designator L?, comment LQP03PN4N7J02D  value 4.7nH  Self Resonant Frequency: 4.4GHz  Max Operating Temperature: 125°C  Mounting Technology: Surface Mount  Tolerance: 5%  Current Rating: 900mA  Case/Package: 0201  RoHS Compliant: Yes  Min Operating Temperature: -55°C
Inductor RF Chip Thick Film 0.0047uH 5% 500MHz 10Q-Factor 0.9A 0.14Ohm DCR 0201 T/R; Case Code (Metric): 0603; Case Code (Imperial): 0201
footprint FP-LQP03PN_02-IPC_B
footprint FP-LQP03PN_02-IPC_C
footprint FP-LQP03PN_02-MFG
footprint FP-LQP03PN_02-IPC_A
pins: 1, 2